# Altium footprint library Pcb-hionyPcbLib.PcbLib: 580 footprints (part 35 of 37)
Each footprint in its own frame and in the unit in brackets; x right, y up, seen from the top. Pads: shape width x height; smd on the part's side, far side on the other; paste and mask are expansions set on the pad; w line width, h text height; cw(c..) or ccw(c..) is an arc to the next point about the centre after c.
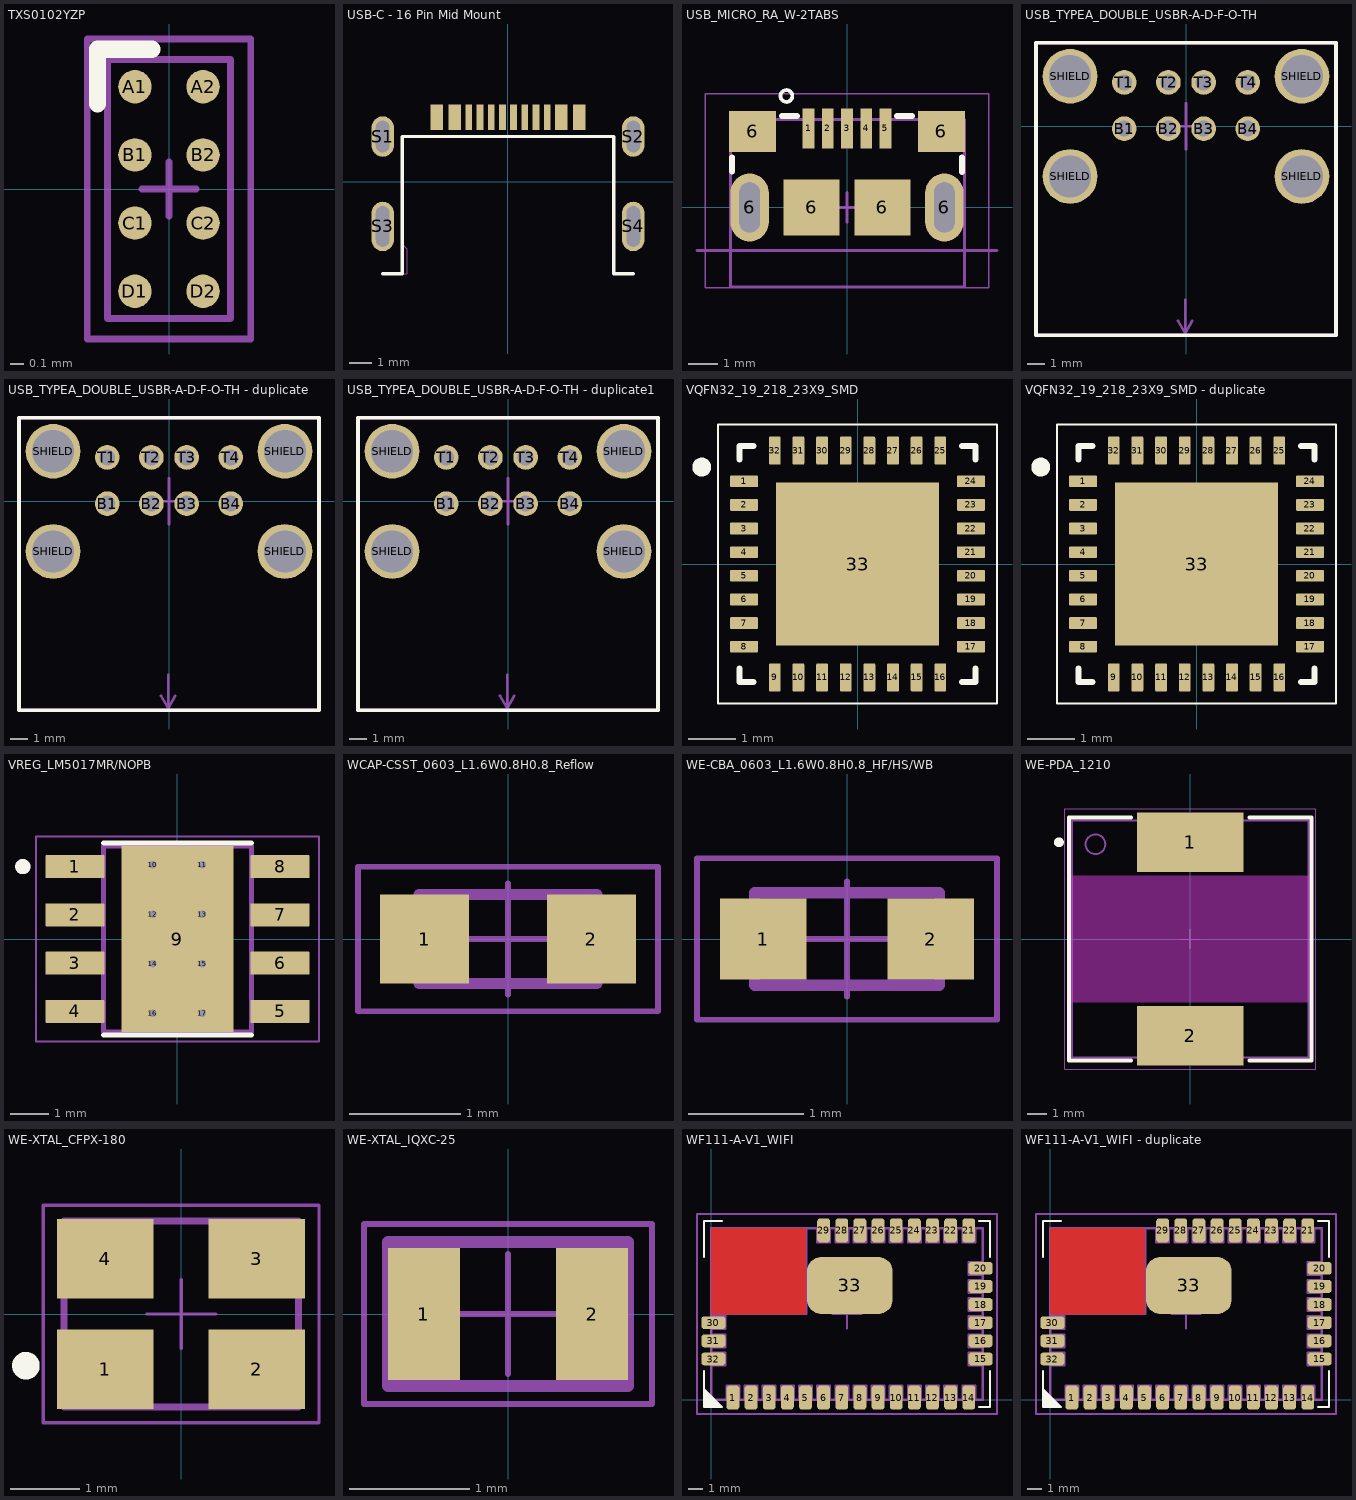
[diagram p34: the footprints below, top view; thin cyan lines are the x and y axes]

## TXS0102YZP [mm]
pads (8):
  round 0.245 smd paste-10 mask+0.05: A1(-0.25,0.75) A2(0.25,0.75) B1(-0.25,0.25) B2(0.25,0.25) C1(-0.25,-0.25) C2(0.25,-0.25) D1(-0.25,-0.75) D2(0.25,-0.75)
Top Overlay:
  lines w0.127: -0.525,0.625 -0.525,1.025 -0.125,1.025
Top Paste:
  drawing of 8 lines, arcs and shapes, not listed
Mechanical 11:
  text ".Designator" at -0.5,-0.1 h0.25
Mechanical 13:
  circle w0.1: c-0.25,0.75 r0.025
  lines w0.05: -0.45,-0.95 -0.45,0.95 0.45,0.95 0.45,-0.95 -0.45,-0.95
Mechanical 15:
  lines w0.05: -0.2,0 0.2,0 ; 0,-0.2 0,0.2 ; -0.6,-1.1 0.6,-1.1 0.6,1.1 -0.6,1.1 -0.6,-1.1
3D body: height 0.25, standoff -0.05, extent -0.391,-0.898 -0.1,-0.602
3D body: height 0.25, standoff -0.05, extent 0.109,-0.898 0.4,-0.602
3D body: height 0.63, standoff 0.63, extent -0.4,0.7 -0.2,0.9
3D body: height 0.25, standoff -0.05, extent -0.391,0.102 -0.1,0.398
3D body: height 0.25, standoff -0.05, extent -0.391,0.602 -0.1,0.898
3D body: height 0.25, standoff -0.05, extent 0.109,0.602 0.4,0.898
3D body: height 0.25, standoff -0.05, extent 0.109,0.102 0.4,0.398
3D body: height 0.25, standoff -0.05, extent -0.391,-0.398 -0.1,-0.102
3D body: height 0.25, standoff -0.05, extent 0.109,-0.398 0.4,-0.102
3D body: height 0.63, standoff 0.2, extent -0.45,-0.95 0.45,0.95

## USB-C - 16 Pin Mid Mount [mm]
pads (20):
  rect 0.3x1.15 smd: A1(-3.3,2.86) A4(-2.5,2.86) A5(-1.25,2.86) A6(-0.25,2.86) A7(0.25,2.86) A8(1.25,2.86) A9(2.5,2.86) A12(3.3,2.86) B1(3.05,2.86) B4(2.25,2.86) B5(1.75,2.86) B6(0.75,2.86) B7(-0.75,2.86) B8(-1.75,2.86) B9(-2.25,2.86) B12(-3.05,2.86)
  oval 1x1.8 hole 0.6 slot 1.4 at 90 deg: S1(-5.575,2) S2(5.575,2)
  oval 1x2.2 hole 0.6 slot 1.8 at 90 deg: S3(-5.575,-2) S4(5.575,-2)
Top Overlay:
  lines w0.15: -5.575,-4.1 -4.7,-4.1 -4.7,2 4.7,2 4.7,-4.1 5.575,-4.1
Mechanical 15:
  lines w0.05: -5.6,-4.1 -4.5,-4.097 -4.503,-2.997 -4.694,-2.807 -4.703,0.715 -4.706,1.975 -3.446,1.979 4.694,2.001 4.71,-4.102 5.6,-4.1
3D body "USB C Mid Mount 16 pin v7.step": height 1.82, standoff -1.34, extent -5.725,-4.829 5.725,3.071

## USB_MICRO_RA_W-2TABS [mm]
pads (11):
  rect 0.4x1.35 smd: 1(-1.3,2.675) 2(-0.65,2.675) 3(0,2.675) 4(0.65,2.675) 5(1.3,2.675)
  oval 1.3x2.3 hole 0.7 slot 1.7 at 90 deg: 6(-3.3,0) 6(3.3,0.001)
  rect 1.6x1.4 smd: 6(-3.2,2.575) 6(3.2,2.575)
  rect 1.9x1.9 smd: 6(-1.2,0) 6(1.2,0)
Top Overlay:
  circle w0.127: c-2.05,3.775 r0.2
  lines w0.2: -3.9,1.225 -3.9,1.7 ; -2.2,3.1 -1.7,3.1 ; 1.7,3.1 2.2,3.1 ; 3.9,1.2 3.9,1.7
Mechanical 11:
  text ".Designator" at -0.575,1.155 h0.5
Mechanical 13:
  lines w0.1: -3.95,-2.7 3.975,-2.7 3.975,2.976 -3.95,2.976 -3.95,-2.7
Mechanical 15:
  lines w0.05: -4.8,3.851 4.8,3.851 4.8,-2.723 -4.8,-2.723 -4.8,3.851
  lines w0.1: -5.08,-1.45 5.08,-1.45 ; -0.5,0 0.5,0 ; 0,-0.5 0,0.5
3D body "10118193-0001lfc.stp": height 2.87, standoff -0.73, extent -3.903,-2.711 3.953,2.95

## USB_TYPEA_DOUBLE_USBR-A-D-F-O-TH [mm]
pads (12):
  round 1.4 hole 0.9 mask+0.05: B1(-3.5,-0.13) B2(-1,-0.13) B3(1,-0.13) B4(3.5,-0.13) T1(-3.5,2.49) T2(-1,2.49) T3(1,2.49) T4(3.5,2.49)
  round 3.1 hole 2.4 mask+0.05: SHIELD(-6.57,-2.84) SHIELD(-6.57,2.84) SHIELD(6.57,-2.84) SHIELD(6.57,2.84)
Top Overlay:
  lines w0.2: -8.5,-11.85 -8.5,4.75 8.5,4.75 8.5,-11.85 -8.5,-11.85
Mechanical 15:
  lines w0.15: -1.3,0 0,0 ; -0.45,-11.025 -0.05,-11.725 ; -0.05,-9.825 -0.05,-11.725 ; 0,-1.3 0,0 ; 0,1.3 0,0 ; 0.35,-11.025 -0.05,-11.725 ; 1.3,0 0,0
  lines w0.2: -8.5,-11.85 8.5,-11.85 8.5,4.75 -8.5,4.75 -8.5,-11.85
  text "PCB edge" at 1.955,-8.565 h0.55
  text "T4" at 4.105,2.985 h0.55
  text ".Designator" at 0.83,-1.815 h0.55
  text "B4" at 4.105,0.285 h0.55
  text "B1" at -3.045,0.26 h0.55
  text "T1" at -2.97,3.06 h0.55
3D body "USBR-A-D-F-O-TH.stp": height 16.1, standoff -4.2, extent -7.799,-13.55 7.798,4.1

## USB_TYPEA_DOUBLE_USBR-A-D-F-O-TH - duplicate [mm]
pads (12):
  round 1.4 hole 0.9 mask+0.05: B1(-3.5,-0.13) B2(-1,-0.13) B3(1,-0.13) B4(3.5,-0.13) T1(-3.5,2.49) T2(-1,2.49) T3(1,2.49) T4(3.5,2.49)
  round 3.1 hole 2.4 mask+0.05: SHIELD(-6.57,-2.84) SHIELD(-6.57,2.84) SHIELD(6.57,-2.84) SHIELD(6.57,2.84)
Top Overlay:
  lines w0.2: -8.5,-11.85 -8.5,4.75 8.5,4.75 8.5,-11.85 -8.5,-11.85
Mechanical 15:
  lines w0.15: -1.3,0 0,0 ; -0.45,-11.025 -0.05,-11.725 ; -0.05,-9.825 -0.05,-11.725 ; 0,-1.3 0,0 ; 0,1.3 0,0 ; 0.35,-11.025 -0.05,-11.725 ; 1.3,0 0,0
  lines w0.2: -8.5,-11.85 8.5,-11.85 8.5,4.75 -8.5,4.75 -8.5,-11.85
  text "T4" at 4.105,2.985 h0.55
  text ".Designator" at 0.83,-1.815 h0.55
  text "T1" at -2.97,3.06 h0.55
  text "B1" at -3.045,0.26 h0.55
  text "PCB edge" at 1.955,-8.565 h0.55
  text "B4" at 4.105,0.285 h0.55
3D body "USBR-A-D-F-O-TH.stp": height 16.1, standoff -4.2, extent -7.799,-13.55 7.798,4.1

## USB_TYPEA_DOUBLE_USBR-A-D-F-O-TH - duplicate1 [mm]
pads (12):
  round 1.4 hole 0.9 mask+0.05: B1(-3.5,-0.13) B2(-1,-0.13) B3(1,-0.13) B4(3.5,-0.13) T1(-3.5,2.49) T2(-1,2.49) T3(1,2.49) T4(3.5,2.49)
  round 3.1 hole 2.4 mask+0.05: SHIELD(-6.57,-2.84) SHIELD(-6.57,2.84) SHIELD(6.57,-2.84) SHIELD(6.57,2.84)
Top Overlay:
  lines w0.2: -8.5,-11.85 -8.5,4.75 8.5,4.75 8.5,-11.85 -8.5,-11.85
Mechanical 15:
  lines w0.15: -1.3,0 0,0 ; -0.45,-11.025 -0.05,-11.725 ; -0.05,-9.825 -0.05,-11.725 ; 0,-1.3 0,0 ; 0,1.3 0,0 ; 0.35,-11.025 -0.05,-11.725 ; 1.3,0 0,0
  lines w0.2: -8.5,-11.85 8.5,-11.85 8.5,4.75 -8.5,4.75 -8.5,-11.85
  text "T4" at 4.105,2.985 h0.55
  text ".Designator" at 0.83,-1.815 h0.55
  text "T1" at -2.97,3.06 h0.55
  text "B1" at -3.045,0.26 h0.55
  text "PCB edge" at 1.955,-8.565 h0.55
  text "B4" at 4.105,0.285 h0.55
3D body "USBR-A-D-F-O-TH.stp": height 16.1, standoff -4.2, extent -7.799,-13.55 7.798,4.1

## VQFN32_19_218_23X9_SMD [mm]
pads (33):
  rrect25% 0.6x0.25 smd mask+0: 1(-2.4,1.75) 2(-2.4,1.25) 3(-2.4,0.75) 4(-2.4,0.25) 5(-2.4,-0.25) 6(-2.4,-0.75) 7(-2.4,-1.25) 8(-2.4,-1.75) 17(2.4,-1.75) 18(2.4,-1.25) 19(2.4,-0.75) 20(2.4,-0.25) 21(2.4,0.25) 22(2.4,0.75) 23(2.4,1.25) 24(2.4,1.75)
  rrect25% 0.25x0.6 smd mask+0: 9(-1.75,-2.4) 10(-1.25,-2.4) 11(-0.75,-2.4) 12(-0.25,-2.4) 13(0.25,-2.4) 14(0.75,-2.4) 15(1.25,-2.4) 16(1.75,-2.4) 25(1.75,2.4) 26(1.25,2.4) 27(0.75,2.4) 28(0.25,2.4) 29(-0.25,2.4) 30(-0.75,2.4) 31(-1.25,2.4) 32(-1.75,2.4)
  rect 3.45x3.45 smd paste-3 mask+0: 33(0,0)
Top Overlay:
  circle w0.2: c-3.295,2.05 r0.1
  lines w0.05: -2.95,-2.95 2.95,-2.95 2.95,2.95 -2.95,2.95 -2.95,-2.95
  lines w0.127: -2.5,-2.205 -2.5,-2.5 -2.205,-2.5 ; -2.5,2.205 -2.5,2.5 -2.205,2.5 ; 2.205,-2.5 2.5,-2.5 2.5,-2.205 ; 2.205,2.5 2.5,2.5 2.5,2.205
Top Paste:
  region: 1.59,-1.59 0.1,-1.59 0.1,-0.1 1.59,-0.1
  region: -0.1,-1.59 -1.59,-1.59 -1.59,-0.1 -0.1,-0.1
  region: 1.59,0.1 0.1,0.1 0.1,1.59 1.59,1.59
  region: -0.1,0.1 -1.59,0.1 -1.59,1.59 -0.1,1.59
Top Solder:
  drawing of 33 lines, arcs and shapes, not listed
3D body "User Library-VQFN-32.step": height 1.01, standoff 0, extent -2.56,-2.56 2.56,2.56

## VQFN32_19_218_23X9_SMD - duplicate [mm]
pads (33):
  rrect25% 0.6x0.25 smd mask+0: 1(-2.4,1.75) 2(-2.4,1.25) 3(-2.4,0.75) 4(-2.4,0.25) 5(-2.4,-0.25) 6(-2.4,-0.75) 7(-2.4,-1.25) 8(-2.4,-1.75) 17(2.4,-1.75) 18(2.4,-1.25) 19(2.4,-0.75) 20(2.4,-0.25) 21(2.4,0.25) 22(2.4,0.75) 23(2.4,1.25) 24(2.4,1.75)
  rrect25% 0.25x0.6 smd mask+0: 9(-1.75,-2.4) 10(-1.25,-2.4) 11(-0.75,-2.4) 12(-0.25,-2.4) 13(0.25,-2.4) 14(0.75,-2.4) 15(1.25,-2.4) 16(1.75,-2.4) 25(1.75,2.4) 26(1.25,2.4) 27(0.75,2.4) 28(0.25,2.4) 29(-0.25,2.4) 30(-0.75,2.4) 31(-1.25,2.4) 32(-1.75,2.4)
  rect 3.45x3.45 smd paste-3 mask+0: 33(0,0)
Top Overlay:
  circle w0.2: c-3.295,2.05 r0.1
  lines w0.05: -2.95,-2.95 -2.95,2.95 2.95,2.95 2.95,-2.95 -2.95,-2.95
  lines w0.127: -2.5,-2.205 -2.5,-2.5 -2.205,-2.5 ; -2.5,2.205 -2.5,2.5 -2.205,2.5 ; 2.205,-2.5 2.5,-2.5 2.5,-2.205 ; 2.205,2.5 2.5,2.5 2.5,2.205
Top Paste:
  region: -0.1,0.1 -1.59,0.1 -1.59,1.59 -0.1,1.59
  region: 1.59,0.1 0.1,0.1 0.1,1.59 1.59,1.59
  region: -0.1,-1.59 -1.59,-1.59 -1.59,-0.1 -0.1,-0.1
  region: 1.59,-1.59 0.1,-1.59 0.1,-0.1 1.59,-0.1
Top Solder:
  drawing of 33 lines, arcs and shapes, not listed
3D body "User Library-VQFN-32.step": height 1.01, standoff 0, extent -2.56,-2.56 2.56,2.56

## VREG_LM5017MR/NOPB [mm]
pads (17):
  rrect5% 1.55x0.6 smd mask+0: 1(-2.7,1.905) 2(-2.7,0.635) 3(-2.7,-0.635) 4(-2.7,-1.905) 5(2.7,-1.905) 6(2.7,-0.635) 7(2.7,0.635) 8(2.7,1.905)
  rect 2.95x4.9 smd paste-3 mask+0: 9(0,0)
  round 0.3 hole 0.2: 10(-0.65,1.95) 11(0.65,1.95) 12(-0.65,0.65) 13(0.65,0.65) 14(-0.65,-0.65) 15(0.65,-0.65) 16(-0.65,-1.95) 17(0.65,-1.95)
Top Overlay:
  circle w0.2: c-4.07,1.905 r0.1
  lines w0.127: -1.95,-2.525 1.95,-2.525 ; -1.95,2.525 1.95,2.525
Top Paste:
  region: 1.355,-1.7 -1.355,-1.7 -1.355,1.7 1.355,1.7
Top Solder:
  drawing of 9 lines, arcs and shapes, not listed
Mechanical 13:
  circle w0.2: c-4.07,1.905 r0.1
  lines w0.127: -1.95,-2.45 -1.95,2.45 1.95,2.45 1.95,-2.45 -1.95,-2.45
Mechanical 15:
  lines w0.05: -3.725,-2.7 -3.725,2.7 3.725,2.7 3.725,-2.7 -3.725,-2.7
3D body "TPS5430DDA.STEP": height 1.7, standoff 0, extent -3,-2.413 3,2.487

## WCAP-CSST_0603_L1.6W0.8H0.8_Reflow [mm] "Soft Termination MLCC, body 1.60x0.80mm"
height 0.8
pads (2):
  rect 0.8x0.8 smd: 1(-0.75,0) 2(0.75,0)
Top Component Outline:
  lines w0.1: -0.8,-0.4 -0.8,0.4 0.8,0.4 0.8,-0.4 -0.8,-0.4
Top Courtyard:
  lines w0.05: -0.5,0 0.5,0 ; 0,-0.5 0,0.5 ; -1.35,-0.65 -1.35,0.65 1.35,0.65 1.35,-0.65 -1.35,-0.65
Top Designator:
  text ".Designator" at -2.499,-0.167 h0.5
3D body "CAPC1608X08N.step": height 0.8, standoff 0, extent -0.8,-0.4 0.8,0.4

## WE-CBA_0603_L1.6W0.8H0.8_HF/HS/WB [mm] "SMD EMI Suppression Ferrite Bead, 2-Leads, body 1.60x0.80mm"
height 1
pads (2):
  rect 0.75x0.7 smd: 1(-0.725,0) 2(0.725,0)
Top Component Outline:
  lines w0.1: -0.8,-0.4 0.8,-0.4 0.8,0.4 -0.8,0.4 -0.8,-0.4
Top Courtyard:
  lines w0.05: -0.5,0 0.5,0 ; 0,-0.5 0,0.5 ; -1.3,-0.7 1.3,-0.7 1.3,0.7 -1.3,0.7 -1.3,-0.7
Top 3D Body:
  lines w0.1: -0.8,-0.4 0.8,-0.4 0.8,0.4 -0.8,0.4 -0.8,-0.4
Top Designator:
  text ".Designator" at -2.499,-0.167 h0.5
3D body "0603_78263x.stp": height 0.8, standoff 0, extent -0.8,-0.4 0.8,0.4

## WE-PDA_1210 [mm] "SMD Shielded Power Inductor, 2-leads, body 12x12mm"
height 10
pads (2):
  rect 5.4x3 smd: 1(0,4.9) 2(0,-4.9)
Top Layer keep-out:
  region: -6,3.2 6,3.2 6,-3.2 -6,-3.2
Top Overlay:
  circle w0.25: c-6.65,4.9 r0.125
  lines w0.2: -3,-6.15 -6.15,-6.15 -6.15,6.15 -3,6.15 ; 3,-6.15 6.15,-6.15 6.15,6.15 3,6.15
Top Component Outline:
  circle w0.1: c-4.8,4.8 r0.5
  lines w0.1: -6,-6 -6,6 6,6 6,-6 -6,-6
Top Courtyard:
  lines w0.05: -0.5,0 0.5,0 ; 0,-0.5 0,0.5 ; -6.35,-6.6 -6.35,6.6 6.35,6.6 6.35,-6.6 -6.35,-6.6
Top 3D Body:
  circle w0.1: c-4.8,4.8 r0.5
  lines w0.1: -6,-6 6,-6 6,6 -6,6 -6,-6
Top Designator:
  text ".Designator" at -7.498,-0.5 h1.5
3D body "IndPDA_1210.stp": height 9.7, standoff 0.04, extent -6,-6 6,6

## WE-XTAL_CFPX-180 [mm] "Quartz Crystal, size CFPX-180, body 3.4x2.7mm"
height 0.8
pads (4):
  rect 1.4x1.15 smd: 1(-1.1,-0.8) 2(1.1,-0.8) 3(1.1,0.8) 4(-1.1,0.8)
Top Overlay:
  circle w0.2: c-2.25,-0.75 r0.1
Top Component Outline:
  circle w0.1: c-1.25,-0.9 r0.2
  lines w0.1: -1.7,-1.35 -1.7,1.35 1.7,1.35 1.7,-1.35 -1.7,-1.35
Top Courtyard:
  lines w0.05: -0.5,0 0.5,0 ; 0,-0.5 0,0.5 ; -2,-1.575 2,-1.575 2,1.575 -2,1.575 -2,-1.575
Top 3D Body:
  lines w0.1: -1.7,-1.35 1.7,-1.35 1.7,1.35 -1.7,1.35 -1.7,-1.35
Top Designator:
  text ".Designator" at -4.998,-0.333 h1
3D body "FrqXTAL_CFPX-180.stp": height 0.65, standoff 0, extent -1.7,-1.35 1.7,1.35

## WE-XTAL_IQXC-25 [mm] "Quartz Crystal, size IQXC-25, body 2x1mm"
height 0.6
pads (2):
  rect 0.6x1.1 smd: 1(-0.7,0) 2(0.7,0)
Top Component Outline:
  lines w0.1: -1,-0.6 -1,0.6 1,0.6 1,-0.6 -1,-0.6
Top Courtyard:
  lines w0.05: -0.5,0 0.5,0 ; 0,-0.5 0,0.5 ; -1.2,-0.75 1.2,-0.75 1.2,0.75 -1.2,0.75 -1.2,-0.75
Top 3D Body:
  lines w0.1: -1,-0.6 1,-0.6 1,0.6 -1,0.6 -1,-0.6
Top Designator:
  text ".Designator" at -3.499,-0.233 h0.7
3D body "FrqXTAL_IQXC-25.stp": height 0.55, standoff 0, extent -1,-0.6 1,0.6

## WF111-A-V1_WIFI [mm]
pads (33):
  rrect50% 0.9x1.7 smd mask+0.05: 1(1.515,0.15) 2(2.785,0.15) 3(4.055,0.15) 4(5.325,0.15) 5(6.595,0.15) 6(7.865,0.15) 7(9.135,0.15) 8(10.405,0.15) 9(11.675,0.15) 10(12.945,0.15) 11(14.215,0.15) 12(15.485,0.15) 13(16.755,0.15) 14(18.025,0.15) 21(18.025,11.85) 22(16.755,11.85) 23(15.485,11.85) 24(14.215,11.85) 25(12.945,11.85) 26(11.675,11.85) 27(10.405,11.85) 28(9.135,11.85) 29(7.865,11.85)
  rrect50% 1.7x0.9 smd mask+0.05: 15(18.85,2.85) 16(18.85,4.12) 17(18.85,5.39) 18(18.85,6.66) 19(18.85,7.93) 20(18.85,9.2) 30(0.15,5.39) 31(0.15,4.12) 32(0.15,2.85)
  rrect50% 6x4 smd mask+0.05: 33(9.7,8)
Top Layer:
  pour cut-out: 0,6 0,12 6.6,12 6.6,6
Top Overlay:
  region: 0.8,-0.5 -0.5,0.8 -0.5,-0.5
  lines w0.15: -0.5,2 -0.5,-0.5 0.75,-0.5 ; -0.5,10 -0.5,12.5 0.75,12.5 ; 18.75,-0.5 19.5,-0.5 19.5,2 ; 18.75,12.5 19.5,12.5 19.5,10
Mechanical 13:
  lines w0.15: 0,6 6.665,6 ; 0,6.6 5.4,12 ; 0,7.9 4.1,12 ; 0,9.2 2.8,12 ; 0,10.5 1.5,12 ; 0.7,6 6.7,12 ; 2,6 6.65,10.65 ; 3.3,6 6.65,9.35 ; 4.6,6 6.65,8.05 ; 5.9,6 6.633,6.732 ; 6.665,6.085 6.665,12 ; 0,0 0,12 19,12 19,0 0,0 ; 0,2.4 0,3.3 1,3.3 1,2.4 0,2.4 ; 0,3.67 1,3.67 1,4.57 0,4.57 0,3.67 ; 0,4.94 1,4.94 1,5.84 0,5.84 0,4.94 ; 1.065,0 1.965,0 1.965,1 1.065,1 1.065,0 ; 2.335,0 3.235,0 3.235,1 2.335,1 2.335,0 ; 3.605,0 3.605,1 4.505,1 4.505,0 3.605,0 ; 4.875,0 4.875,1 5.775,1 5.775,0 4.875,0 ; 6.145,0 6.145,1 7.045,1 7.045,0 6.145,0 ; 7.415,0 7.415,1 8.315,1 8.315,0 7.415,0 ; 7.415,11 8.315,11 8.315,12 7.415,12 7.415,11 ; 8.685,0 8.685,1 9.585,1 9.585,0 8.685,0 ; 8.685,11 9.585,11 9.585,12 8.685,12 8.685,11 ; 9.955,0 9.955,1 10.855,1 10.855,0 9.955,0 ; 9.955,11 10.855,11 10.855,12 9.955,12 9.955,11 ; 11.225,0 12.125,0 12.125,1 11.225,1 11.225,0 ; 11.225,11 11.225,12 12.125,12 12.125,11 11.225,11 ; 12.495,0 13.395,0 13.395,1 12.495,1 12.495,0 ; 12.495,11 12.495,12 13.395,12 13.395,11 12.495,11 ; 13.765,0 14.665,0 14.665,1 13.765,1 13.765,0 ; 13.765,11 13.765,12 14.665,12 14.665,11 13.765,11 ; 15.035,0 15.935,0 15.935,1 15.035,1 15.035,0 ; 15.035,11 15.035,12 15.935,12 15.935,11 15.035,11 ; 16.305,0 17.205,0 17.205,1 16.305,1 16.305,0 ; 16.305,11 16.305,12 17.205,12 17.205,11 16.305,11 ; 17.575,0 17.575,1 18.475,1 18.475,0 17.575,0 ; 17.575,11 18.475,11 18.475,12 17.575,12 17.575,11 ; 18,2.4 18,3.3 19,3.3 19,2.4 18,2.4 ; 18,3.67 19,3.67 19,4.57 18,4.57 18,3.67 ; 18,4.94 19,4.94 19,5.84 18,5.84 18,4.94 ; 18,6.21 19,6.21 19,7.11 18,7.11 18,6.21 ; 18,7.48 19,7.48 19,8.38 18,8.38 18,7.48 ; 18,8.75 19,8.75 19,9.65 18,9.65 18,8.75
  text "NO GND" at 2.1,8.5 h0.55
Mechanical 15:
  lines w0.15: 8.5,6 9.5,6 ; 9.5,5 9.5,6 ; 9.5,7 9.5,6 ; 10.5,6 9.5,6 ; -1,-1 20,-1 20,13 -1,13 -1,-1
  text "1" at 1.7,0.54 h0.55
  text "21" at 18.55,12.19 h0.55
  text "29" at 8.35,12.215 h0.55
  text "14" at 18.525,0.54 h0.55
  text ".Designator" at 10.425,4.965 h0.55
3D body: height 2, standoff 0.8, extent 0.225,9.725 1.225,11.725
3D body: height 2, standoff 0.8, extent 6.75,1.25 19,10.75
3D body: height 0.8, standoff 0, extent 0,0 19,12

## WF111-A-V1_WIFI - duplicate [mm]
pads (33):
  rrect50% 0.9x1.7 smd mask+0.05: 1(1.515,0.15) 2(2.785,0.15) 3(4.055,0.15) 4(5.325,0.15) 5(6.595,0.15) 6(7.865,0.15) 7(9.135,0.15) 8(10.405,0.15) 9(11.675,0.15) 10(12.945,0.15) 11(14.215,0.15) 12(15.485,0.15) 13(16.755,0.15) 14(18.025,0.15) 21(18.025,11.85) 22(16.755,11.85) 23(15.485,11.85) 24(14.215,11.85) 25(12.945,11.85) 26(11.675,11.85) 27(10.405,11.85) 28(9.135,11.85) 29(7.865,11.85)
  rrect50% 1.7x0.9 smd mask+0.05: 15(18.85,2.85) 16(18.85,4.12) 17(18.85,5.39) 18(18.85,6.66) 19(18.85,7.93) 20(18.85,9.2) 30(0.15,5.39) 31(0.15,4.12) 32(0.15,2.85)
  rrect50% 6x4 smd mask+0.05: 33(9.7,8)
Top Layer:
  pour cut-out: 0,6 0,12 6.6,12 6.6,6
Top Overlay:
  region: 0.8,-0.5 -0.5,0.8 -0.5,-0.5
  lines w0.15: -0.5,2 -0.5,-0.5 0.75,-0.5 ; -0.5,10 -0.5,12.5 0.75,12.5 ; 18.75,-0.5 19.5,-0.5 19.5,2 ; 18.75,12.5 19.5,12.5 19.5,10
Mechanical 13:
  lines w0.15: 0,6 6.665,6 ; 0,6.6 5.4,12 ; 0,7.9 4.1,12 ; 0,9.2 2.8,12 ; 0,10.5 1.5,12 ; 0.7,6 6.7,12 ; 2,6 6.65,10.65 ; 3.3,6 6.65,9.35 ; 4.6,6 6.65,8.05 ; 5.9,6 6.633,6.732 ; 6.665,6.085 6.665,12 ; 0,0 0,12 19,12 19,0 0,0 ; 0,2.4 0,3.3 1,3.3 1,2.4 0,2.4 ; 0,3.67 1,3.67 1,4.57 0,4.57 0,3.67 ; 0,4.94 1,4.94 1,5.84 0,5.84 0,4.94 ; 1.065,0 1.965,0 1.965,1 1.065,1 1.065,0 ; 2.335,0 3.235,0 3.235,1 2.335,1 2.335,0 ; 3.605,0 3.605,1 4.505,1 4.505,0 3.605,0 ; 4.875,0 4.875,1 5.775,1 5.775,0 4.875,0 ; 6.145,0 6.145,1 7.045,1 7.045,0 6.145,0 ; 7.415,0 7.415,1 8.315,1 8.315,0 7.415,0 ; 7.415,11 8.315,11 8.315,12 7.415,12 7.415,11 ; 8.685,0 8.685,1 9.585,1 9.585,0 8.685,0 ; 8.685,11 9.585,11 9.585,12 8.685,12 8.685,11 ; 9.955,0 9.955,1 10.855,1 10.855,0 9.955,0 ; 9.955,11 10.855,11 10.855,12 9.955,12 9.955,11 ; 11.225,0 12.125,0 12.125,1 11.225,1 11.225,0 ; 11.225,11 11.225,12 12.125,12 12.125,11 11.225,11 ; 12.495,0 13.395,0 13.395,1 12.495,1 12.495,0 ; 12.495,11 12.495,12 13.395,12 13.395,11 12.495,11 ; 13.765,0 14.665,0 14.665,1 13.765,1 13.765,0 ; 13.765,11 13.765,12 14.665,12 14.665,11 13.765,11 ; 15.035,0 15.935,0 15.935,1 15.035,1 15.035,0 ; 15.035,11 15.035,12 15.935,12 15.935,11 15.035,11 ; 16.305,0 17.205,0 17.205,1 16.305,1 16.305,0 ; 16.305,11 16.305,12 17.205,12 17.205,11 16.305,11 ; 17.575,0 17.575,1 18.475,1 18.475,0 17.575,0 ; 17.575,11 18.475,11 18.475,12 17.575,12 17.575,11 ; 18,2.4 18,3.3 19,3.3 19,2.4 18,2.4 ; 18,3.67 19,3.67 19,4.57 18,4.57 18,3.67 ; 18,4.94 19,4.94 19,5.84 18,5.84 18,4.94 ; 18,6.21 19,6.21 19,7.11 18,7.11 18,6.21 ; 18,7.48 19,7.48 19,8.38 18,8.38 18,7.48 ; 18,8.75 19,8.75 19,9.65 18,9.65 18,8.75
  text "NO GND" at 2.1,8.5 h0.55
Mechanical 15:
  lines w0.15: 8.5,6 9.5,6 ; 9.5,5 9.5,6 ; 9.5,7 9.5,6 ; 10.5,6 9.5,6 ; -1,-1 20,-1 20,13 -1,13 -1,-1
  text "14" at 18.525,0.54 h0.55
  text "1" at 1.7,0.54 h0.55
  text ".Designator" at 10.425,4.965 h0.55
  text "21" at 18.55,12.19 h0.55
  text "29" at 8.35,12.215 h0.55
3D body: height 2, standoff 0.8, extent 0.225,9.725 1.225,11.725
3D body: height 2, standoff 0.8, extent 6.75,1.25 19,10.75
3D body: height 0.8, standoff 0, extent 0,0 19,12